# Altium footprint library fszhang.PcbLib: 1032 footprints (part 65 of 66)
Each footprint in its own frame and in the unit in brackets; x right, y up, seen from the top. Pads: shape width x height; smd on the part's side, far side on the other; paste and mask are expansions set on the pad; w line width, h text height; cw(c..) or ccw(c..) is an arc to the next point about the centre after c.
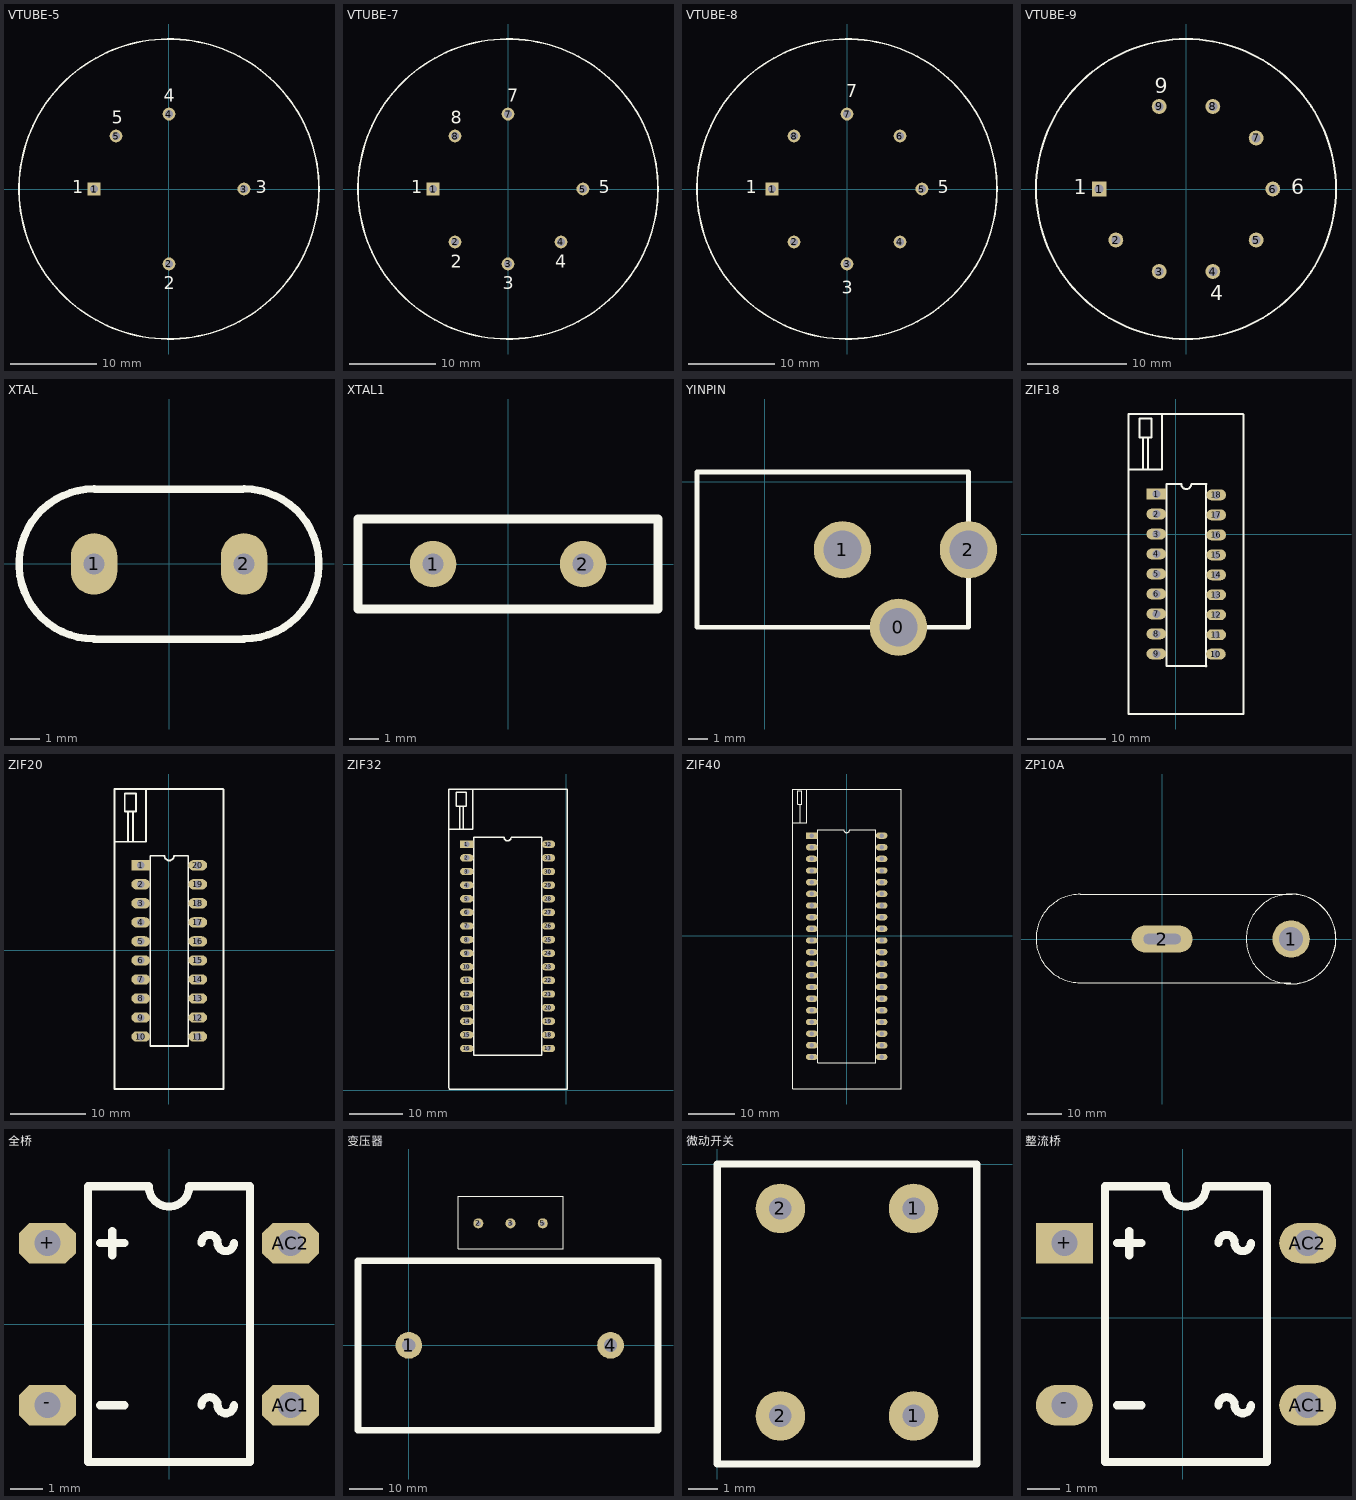
[diagram p64: the footprints below, top view; thin cyan lines are the x and y axes]

## VTUBE-5 [mm] "Thyratron; 5 Leads"
pads (5):
  rect 1.5x1.5 hole 0.9: 1(-8.725,0)
  round 1.5 hole 0.9: 2(0,-8.725) 3(8.725,0) 4(0,8.725) 5(-6.17,6.17)
Top Overlay:
  circle w0.2: c0,0 r17.462
  text "1" at -11.265,-0.508 h1.5
  text "2" at -0.597,-11.684 h1.5
  text "4" at -0.597,10.16 h1.5
  text "5" at -6.693,7.62 h1.5
  text "3" at 10.071,-0.508 h1.5

## VTUBE-7 [mm] "Beam Power Pentode; 7 Leads"
height 108
pads (7):
  rect 1.5x1.5 hole 0.9: 1(-8.725,0)
  round 1.5 hole 0.9: 2(-6.17,-6.17) 3(0,-8.725) 4(6.17,-6.17) 5(8.725,0) 7(0,8.725) 8(-6.17,6.17)
Top Overlay:
  circle w0.2: c0,0 r17.462
  text "8" at -6.693,7.62 h1.5
  text "7" at -0.089,10.16 h1.5
  text "5" at 10.579,-0.508 h1.5
  text "4" at 5.499,-9.144 h1.5
  text "3" at -0.597,-11.684 h1.5
  text "2" at -6.693,-9.144 h1.5
  text "1" at -11.265,-0.508 h1.5

## VTUBE-8 [mm] "Medium Mu Dual Triode; 8 Leads"
height 108
pads (8):
  rect 1.5x1.5 hole 0.9: 1(-8.725,0)
  round 1.5 hole 0.9: 2(-6.17,-6.17) 3(0,-8.725) 4(6.17,-6.17) 5(8.725,0) 6(6.17,6.17) 7(0,8.725) 8(-6.17,6.17)
Top Overlay:
  circle w0.2: c0,0 r17.462
  text "1" at -11.773,-0.508 h1.5
  text "3" at -0.597,-12.192 h1.5
  text "5" at 10.579,-0.508 h1.5
  text "7" at -0.089,10.668 h1.5

## VTUBE-9 [mm] "Medium Mu Dual Triode; 9 Leads"
height 55.6
pads (9):
  rect 1.5x1.5 hole 0.9: 1(-8.725,0)
  round 1.5 hole 0.9: 2(-7.059,-5.128) 3(-2.696,-8.298) 4(2.696,-8.298) 5(7.059,-5.128) 6(8.725,0) 7(7.059,5.128) 8(2.696,8.298) 9(-2.696,8.298)
Top Overlay:
  circle w0.2: c0,0 r15.081
  text "1" at -11.265,-0.508 h1.5
  text "9" at -3.137,9.652 h1.5
  text "6" at 10.579,-0.508 h1.5
  text "4" at 2.451,-11.176 h1.5

## XTAL [mil]
pads (2):
  oval 62x82 hole 28: 1(-100,0) 2(100,0)
Top Overlay:
  lines w10: -100,-100.39 99.8,-100.39 ; -100,-100 cw(c-100,0) -100,100 ; -99.02,99.41 98.62,99.37 ; 100,-100 ccw(c100,0) 100,100

## XTAL1 [mil]
pads (2):
  round 62 hole 28: 1(-100,0) 2(100,0)
Top Overlay:
  lines w12: -200,-60 200,-60 200,60 -200,60 -200,-60

## YINPIN [mm]
pads (3):
  round 3 hole 2: 0(7,-7.62) 1(4.064,-3.556) 2(10.668,-3.556)
Top Overlay:
  lines w0.254: -3.556,-7.62 10.668,-7.62 10.668,0.508 -3.556,0.508 -3.556,-7.62

## ZIF18 [mm]
pads (18):
  rect 2.5x1.38 hole 1: 1(-2.473,5.101)
  oval 2.5x1.38 hole 1: 2(-2.473,2.561) 3(-2.473,0.021) 4(-2.473,-2.519) 5(-2.473,-5.059) 6(-2.473,-7.599) 7(-2.473,-10.139) 8(-2.473,-12.679) 9(-2.473,-15.219) 10(5.105,-15.253) 11(5.147,-12.793) 12(5.147,-10.253) 13(5.147,-7.713) 14(5.147,-5.173) 15(5.147,-2.633) 16(5.147,-0.093) 17(5.147,2.447) 18(5.147,4.987)
Top Overlay:
  lines w0.254: -6.007,-22.873 8.534,-22.873 ; -6.007,-22.72 -5.995,-13.135 -5.995,-2.011 -5.995,15.287 -5.725,15.287 8.549,15.287 ; -5.995,8.249 -1.747,8.249 -1.747,15.251 ; -4.159,8.339 -4.159,12.299 ; -3.511,8.249 -3.511,12.299 ; 3.873,-16.815 3.873,6.35 ; 3.877,-16.794 -1.203,-16.794 -1.203,6.371 0.702,6.371 ccw(c1.337,6.371) 1.972,6.371 3.877,6.371 ; 8.585,-22.873 8.603,-12.883 8.603,-1.885 8.603,15.233 ; -4.609,12.317 -4.609,14.711 -3.115,14.711 -3.079,14.675 -3.079,12.299 -4.591,12.299 -4.609,12.317

## ZIF20 [mm]
pads (20):
  rect 2.5x1.38 hole 1: 1(-3.768,11.324)
  oval 2.5x1.38 hole 1: 2(-3.768,8.784) 3(-3.768,6.244) 4(-3.768,3.704) 5(-3.768,1.164) 6(-3.768,-1.376) 7(-3.768,-3.916) 8(-3.768,-6.456) 9(-3.768,-8.996) 10(-3.768,-11.536) 11(3.852,-11.536) 12(3.852,-8.996) 13(3.852,-6.456) 14(3.852,-3.916) 15(3.852,-1.376) 16(3.852,1.164) 17(3.852,3.704) 18(3.852,6.244) 19(3.852,8.784) 20(3.852,11.324)
Top Overlay:
  lines w0.254: -7.29,-18.504 -7.29,-6.912 -7.29,4.212 -7.29,21.51 -7.02,21.51 7.254,21.51 ; -7.29,14.472 -3.042,14.472 -3.042,21.474 ; -7.254,-18.54 3.834,-18.54 6.102,-18.54 7.272,-18.54 ; -5.454,14.562 -5.454,18.522 ; -4.806,14.472 -4.806,18.522 ; 7.308,-18.504 7.308,-6.66 7.308,4.338 7.308,21.456 ; -5.904,18.54 -5.886,18.522 -4.374,18.522 -4.374,20.898 -4.41,20.934 -5.904,20.934 -5.904,18.54 ; -2.498,-12.806 2.582,-12.806 2.582,12.594 0.677,12.594 cw(c0.042,12.594) -0.593,12.594 -2.498,12.594 -2.498,-12.806

## ZIF32 [mm]
pads (32):
  rect 2.5x1.38 hole 1: 1(-18.548,45.86)
  oval 2.5x1.38 hole 1: 2(-18.548,43.32) 3(-18.548,40.78) 4(-18.548,38.24) 5(-18.548,35.7) 6(-18.548,33.16) 7(-18.548,30.62) 8(-18.548,28.08) 9(-18.548,25.54) 10(-18.548,23) 11(-18.548,20.46) 12(-18.548,17.92) 13(-18.548,15.38) 14(-18.548,12.84) 15(-18.548,10.3) 16(-18.548,7.76) 17(-3.308,7.76) 18(-3.308,10.3) 19(-3.308,12.84) 20(-3.308,15.38) 21(-3.308,17.92) 22(-3.308,20.46) 23(-3.308,23) 24(-3.308,25.54) 25(-3.308,28.08) 26(-3.308,30.62) 27(-3.308,33.16) 28(-3.308,35.7) 29(-3.308,38.24) 30(-3.308,40.78) 31(-3.308,43.32) 32(-3.308,45.86)
Top Overlay:
  lines w0.254: -21.87,48.654 -17.514,48.654 -17.46,48.708 -17.46,56.178 ; -21.618,56.178 0.162,56.178 0.162,43.506 0.162,37.89 0.162,0.198 -21.852,0.198 -21.87,0.63 -21.87,36.126 -21.87,43.416 -21.87,55.782 -21.87,56.178 -20.79,56.178 ; -19.872,48.654 -19.872,52.938 ; -19.242,48.654 -19.242,52.938 ; -20.538,52.938 -18.666,52.938 -18.666,55.566 -20.538,55.566 -20.538,52.938 ; -17.278,6.49 -17.278,47.13 -11.563,47.13 ccw(c-10.928,47.13) -10.293,47.13 -4.578,47.13 -4.578,6.49 -17.278,6.49

## ZIF40 [mm]
pads (40):
  rect 2.5x1.38 hole 1: 1(-7.609,21.848)
  oval 2.5x1.38 hole 1: 2(-7.609,19.308) 3(-7.609,16.768) 4(-7.609,14.228) 5(-7.609,11.688) 6(-7.609,9.148) 7(-7.609,6.608) 8(-7.609,4.068) 9(-7.609,1.528) 10(-7.609,-1.012) 11(-7.609,-3.552) 12(-7.609,-6.092) 13(-7.609,-8.632) 14(-7.609,-11.172) 15(-7.609,-13.712) 16(-7.609,-16.252) 17(-7.609,-18.792) 18(-7.609,-21.332) 19(-7.609,-23.872) 20(-7.609,-26.412) 21(7.631,-26.412) 22(7.631,-23.872) 23(7.631,-21.332) 24(7.631,-18.792) 25(7.631,-16.252) 26(7.631,-13.712) 27(7.631,-11.172) 28(7.631,-8.632) 29(7.631,-6.092) 30(7.631,-3.552) 31(7.631,-1.012) 32(7.631,1.528) 33(7.631,4.068) 34(7.631,6.608) 35(7.631,9.148) 36(7.631,11.688) 37(7.631,14.228) 38(7.631,16.768) 39(7.631,19.308) 40(7.631,21.848)
Top Overlay:
  lines w0.254: -11.8,21.848 -11.8,32.008 11.949,32.008 11.949,21.848 11.949,-33.397 -9.006,-33.397 ; -11.8,22.61 -11.8,-33.397 -8.879,-33.397 ; -11.673,24.642 -8.752,24.642 -8.752,26.801 -8.752,32.008 ; -10.149,24.642 -10.149,28.706 ; -9.768,28.833 -9.768,28.706 ; -9.768,28.706 -10.657,28.706 -10.657,31.627 -9.768,31.627 -9.768,28.706 ; -6.339,-27.682 6.361,-27.682 6.361,23.118 0.646,23.118 cw(c0.011,23.118) -0.624,23.118 -6.339,23.118 -6.339,-27.682

## ZP10A [mm]
pads (2):
  round 11 hole 7: 1(38,0)
  oval 18x8 hole 3 slot 11 at 0 deg: 2(0,0)
Top Overlay:
  circle w0.254: c38,0 r13.233
  lines w0.254: -24.13,13.208 38.354,13.208 ; -24.128,13.131 ccw(c-24.18,0.127) -24.262,-12.877 37.967,-12.877 ; 37.967,-13.182 ccw(c38,0) 38.227,13.18

## 全桥 [mil]
pads (4):
  oct 70x50 hole 32: +(-150,100) -(-150,-100) AC1(150,-100) AC2(150,100)
Top Overlay:
  lines w10: -85,-100 -55,-100 ; -85,100 -55,100 ; -70,85 -70,115 ; 40,-100 cw(c50,-100) 60,-100 ccw(c70,-100) 80,-100 ; 40,100 cw(c50,100) 60,100 ccw(c70,100) 80,100 ; -100,-170 -100,170 -25,170 ccw(c0,170) 25,170 100,170 100,-170 -100,-170

## 变压器 [mm]
pads (5):
  round 8 hole 4: 1(0,0) 4(60.452,0)
  round 3 hole 1.5: 2(20.828,36.576) 3(30.48,36.576) 5(40.132,36.576)
Top Overlay:
  lines w0.254: -15.24,-25.4 -14.732,-25.908 ; 14.732,28.956 20.828,28.956 45.212,28.956 46.228,28.956 46.228,44.704 45.212,44.704 14.732,44.704 14.732,36.576 14.732,29.972 14.732,28.956
  lines w2: 0,25.4 74.676,25.4 74.676,-25.4 -12.192,-25.4 -15.24,-25.4 -15.24,25.4 -12.192,25.4 0.508,25.4

## 微动开关 [mil]
pads (4):
  round 66.93 hole 30: 1(265,-340) 1(265,-60) 2(85,-340) 2(85,-60)
Top Overlay:
  lines w10: 0,-405 0,0 350,0 350,-405 0,-405

## 整流桥 [mil]
pads (4):
  rect 70x50 hole 32: +(-145.75,91.89)
  oval 70x50 hole 32: -(-145.75,-108.11) AC1(154.25,-108.11) AC2(154.25,91.89)
Top Overlay:
  lines w10: -80.75,-108.11 -50.75,-108.11 ; -80.75,91.89 -50.75,91.89 ; -65.75,76.89 -65.75,106.89 ; 44.25,-108.11 cw(c54.25,-108.11) 64.25,-108.11 ccw(c74.25,-108.11) 84.25,-108.11 ; 44.25,91.89 cw(c54.25,91.89) 64.25,91.89 ccw(c74.25,91.89) 84.25,91.89 ; -95.75,-178.11 -95.75,161.89 -20.75,161.89 ccw(c4.25,161.89) 29.25,161.89 104.25,161.89 104.25,-178.11 -95.75,-178.11